# Altium footprint library Molex FFC - FPC Connectors (Through-Hole).PcbLib: 219 footprints (part 1 of 14)
Each footprint in its own frame and in the unit in brackets; x right, y up, seen from the top. Pads: shape width x height; smd on the part's side, far side on the other; paste and mask are expansions set on the pad; w line width, h text height; cw(c..) or ccw(c..) is an arc to the next point about the centre after c.
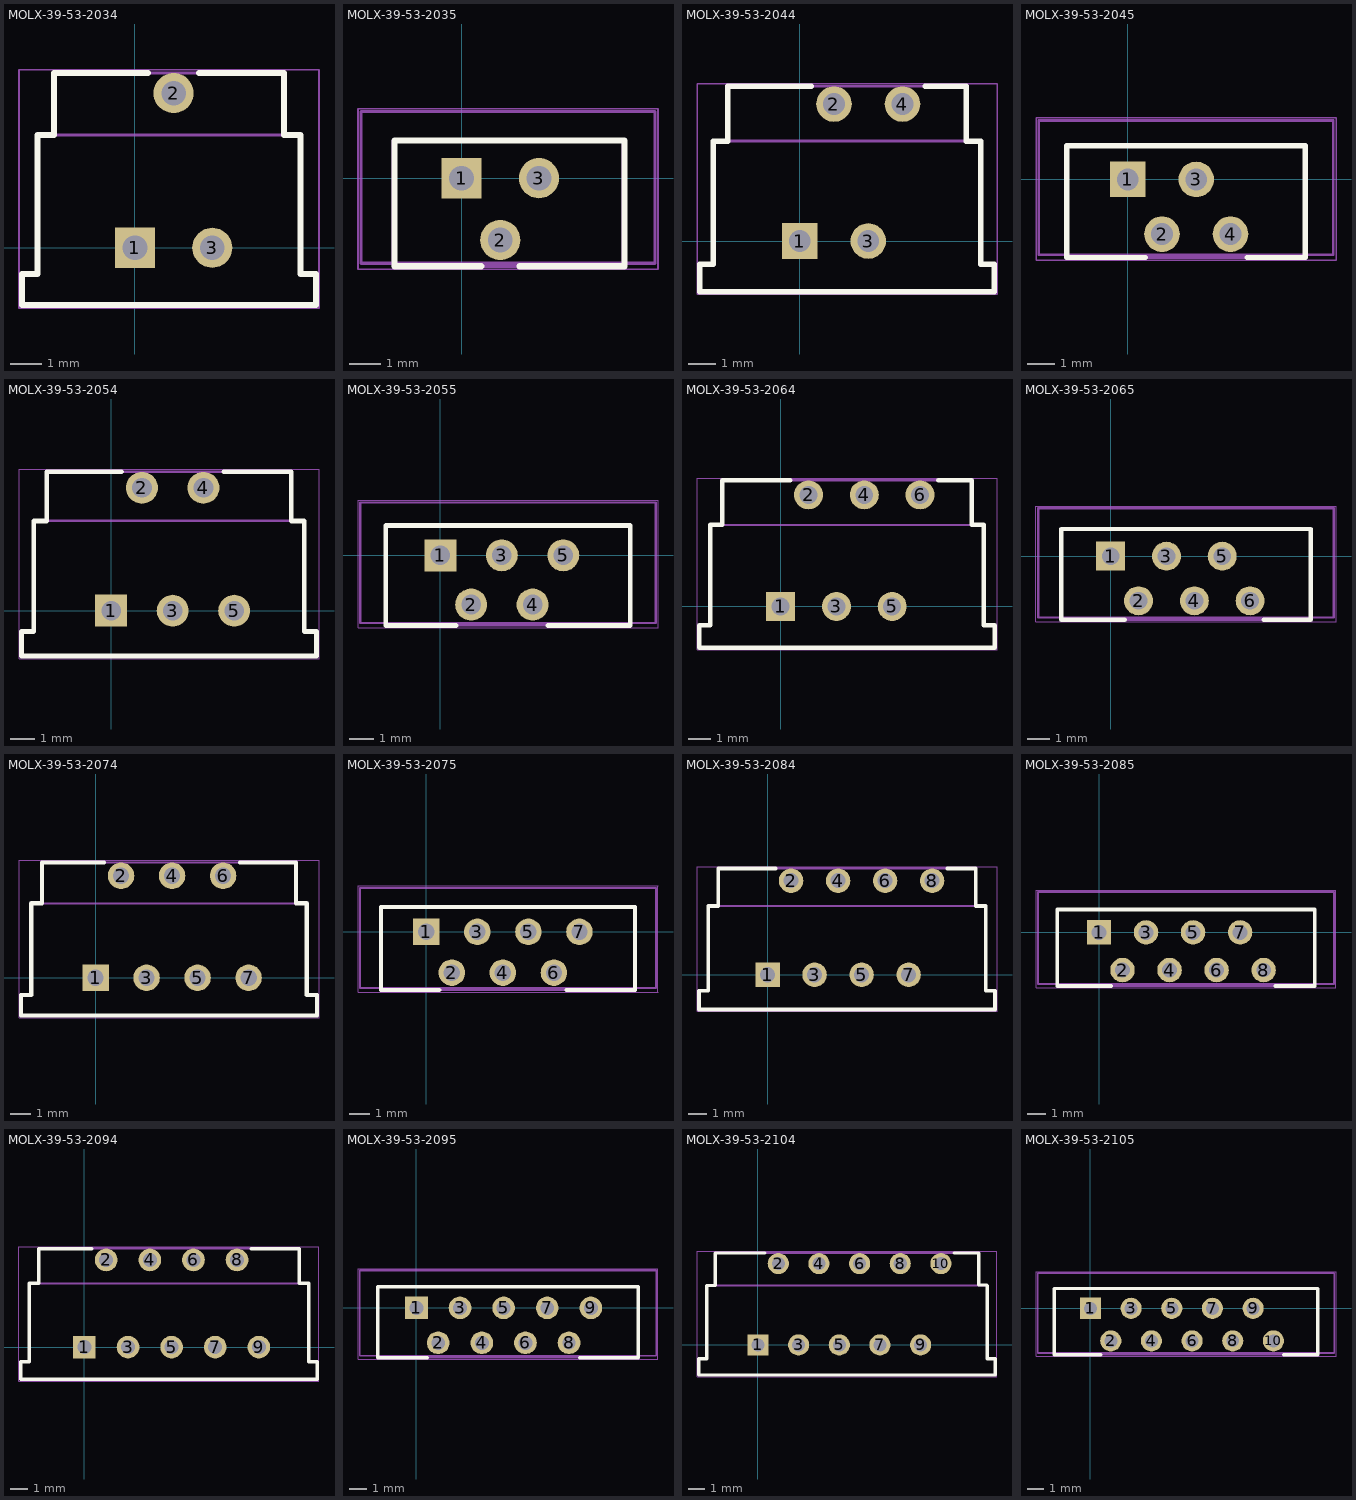
[diagram p0: the footprints below, top view; thin cyan lines are the x and y axes]

## MOLX-39-53-2034 [mm] "FPC Connector, 3-Leads, Right Angle, Pitch 1.25 mm, Mated Height 5.0 mm, Through Hole"
height 5.412
pads (3):
  rect 1.3x1.3 hole 0.8: 1(0,0)
  round 1.3 hole 0.8: 2(1.25,5) 3(2.5,0)
Top Overlay:
  lines w0.2: 0.425,5.65 -2.62,5.65 -2.62,3.649 -3.15,3.649 -3.15,-0.85 -3.65,-0.85 -3.65,-1.85 5.85,-1.85 ; 2.075,5.65 4.82,5.65 4.82,3.649 5.35,3.649 5.35,-0.85 5.85,-0.85 5.85,-1.85
Mechanical 13:
  lines w0.1: -2.62,3.649 -3.15,3.649 -3.15,-0.85 -3.65,-0.85 -3.65,-1.85 5.85,-1.85 ; 4.82,3.649 4.82,5.65 -2.62,5.65 -2.62,3.649 5.35,3.649 5.35,-0.85 5.85,-0.85 5.85,-1.85
Mechanical 15:
  lines w0.05: -3.75,-1.95 -3.75,5.75 5.95,5.75 5.95,-1.95 -3.75,-1.95
3D body "039532034.stp": height 5.41, standoff -3.49, extent -3.65,-1.85 5.85,5.65

## MOLX-39-53-2035 [mm] "FPC Connector, 3-Leads, Vertical, Pitch 1.25 mm, Mated Height 7.5 mm, Through Hole"
height 7.512
pads (3):
  rect 1.3x1.3 hole 0.8: 1(0,0)
  round 1.3 hole 0.8: 2(1.25,-2) 3(2.5,0)
Top Overlay:
  lines w0.2: 0.633,-2.85 -2.17,-2.85 -2.17,1.22 5.27,1.22 5.27,-2.85 1.867,-2.85
Mechanical 13:
  lines w0.1: -3.25,-2.75 -3.25,2.15 6.25,2.15 6.25,-2.75 -3.25,-2.75 ; -2.22,-2.85 5.22,-2.85 5.22,1.22 -2.22,1.22 -2.22,-2.85
Mechanical 15:
  lines w0.05: -3.35,-2.95 -3.35,2.25 6.35,2.25 6.35,-2.95 -3.35,-2.95
3D body "039532035.stp": height 7.51, standoff -3.49, extent -3.25,-2.85 6.25,2.15

## MOLX-39-53-2044 [mm] "FPC Connector, 4-Leads, Right Angle, Pitch 1.25 mm, Mated Height 5.0 mm, Through Hole"
height 5.412
pads (4):
  rect 1.3x1.3 hole 0.8: 1(0,0)
  round 1.3 hole 0.8: 2(1.25,5) 3(2.5,0) 4(3.75,5)
Top Overlay:
  lines w0.2: 0.425,5.65 -2.62,5.65 -2.62,3.65 -3.15,3.65 -3.15,-0.85 -3.65,-0.85 -3.65,-1.85 7.1,-1.85 7.1,-0.85 6.6,-0.85 6.6,3.65 6.07,3.65 6.07,5.65 4.575,5.65
Mechanical 13:
  lines w0.1: -3.15,3.65 -3.15,-0.85 -3.65,-0.85 -3.65,-1.85 7.1,-1.85 7.1,-0.85 6.6,-0.85 6.6,3.65 -3.15,3.65 ; -2.62,3.65 -2.62,5.65 6.07,5.65 6.07,3.65
Mechanical 15:
  lines w0.05: -3.75,-1.95 -3.75,5.75 7.2,5.75 7.2,-1.95 -3.75,-1.95
3D body "039532044.stp": height 5.41, standoff -3.49, extent -3.65,-1.85 7.1,5.65

## MOLX-39-53-2045 [mm] "FPC Connector, 4-Leads, Vertical, Pitch 1.25 mm, Mated Height 7.5 mm, Through Hole"
height 7.512
pads (4):
  rect 1.3x1.3 hole 0.8: 1(0,0)
  round 1.3 hole 0.8: 2(1.25,-2) 3(2.5,0) 4(3.75,-2)
Top Overlay:
  lines w0.2: 0.633,-2.85 -2.22,-2.85 -2.22,1.22 6.47,1.22 6.47,-2.85 4.367,-2.85
Mechanical 13:
  lines w0.1: -3.25,-2.75 7.5,-2.75 7.5,2.15 -3.25,2.15 -3.25,-2.75 ; -2.22,-2.85 6.47,-2.85 6.47,1.22 -2.22,1.22 -2.22,-2.85
Mechanical 15:
  lines w0.05: -3.35,-2.95 7.6,-2.95 7.6,2.25 -3.35,2.25 -3.35,-2.95
3D body "039532045.stp": height 7.51, standoff -3.49, extent -3.25,-2.85 7.5,2.15

## MOLX-39-53-2054 [mm] "FPC Connector, 5-Leads, Right Angle, Pitch 1.25 mm, Mated Height 5.0 mm, Through Hole"
height 5.412
pads (5):
  rect 1.3x1.3 hole 0.8: 1(0,0)
  round 1.3 hole 0.8: 2(1.25,5) 3(2.5,0) 4(3.75,5) 5(5,0)
Top Overlay:
  lines w0.2: 0.425,5.65 -2.62,5.65 -2.62,3.65 -3.15,3.65 -3.15,-0.85 -3.65,-0.85 -3.65,-1.85 8.35,-1.85 8.35,-0.85 7.85,-0.85 7.85,3.65 7.32,3.65 7.32,5.65 4.575,5.65
Mechanical 13:
  lines w0.1: -3.15,3.65 -3.15,-0.85 -3.65,-0.85 -3.65,-1.85 8.35,-1.85 8.35,-0.85 7.85,-0.85 7.85,3.65 -3.15,3.65 ; -2.62,3.65 -2.62,5.65 7.32,5.65 7.32,3.65
Mechanical 15:
  lines w0.05: -3.75,-1.95 -3.75,5.75 8.45,5.75 8.45,-1.95 -3.75,-1.95
3D body "039532054.stp": height 5.41, standoff -3.49, extent -3.65,-1.85 8.35,5.65

## MOLX-39-53-2055 [mm] "FPC Connector, 5-Leads, Vertical, Pitch 1.25 mm, Mated Height 7.5 mm, Through Hole"
height 7.512
pads (5):
  rect 1.3x1.3 hole 0.8: 1(0,0)
  round 1.3 hole 0.8: 2(1.25,-2) 3(2.5,0) 4(3.75,-2) 5(5,0)
Top Overlay:
  lines w0.2: 0.633,-2.85 -2.22,-2.85 -2.22,1.22 7.72,1.22 7.72,-2.85 4.367,-2.85
Mechanical 13:
  lines w0.1: -3.25,-2.75 -3.25,-2.75 ; -3.25,-2.75 8.75,-2.75 ; -3.25,-2.75 -3.25,2.15 8.75,2.15 8.75,-2.75 ; 8.75,-2.75 8.75,-2.75 ; -2.22,-2.85 7.72,-2.85 7.72,1.22 -2.22,1.22 -2.22,-2.85
Mechanical 15:
  lines w0.05: -3.35,-2.95 8.85,-2.95 8.85,2.25 -3.35,2.25 -3.35,-2.95
3D body "039532055.stp": height 7.51, standoff -3.49, extent -3.25,-2.85 8.75,2.15

## MOLX-39-53-2064 [mm] "FPC Connector, 6-Leads, Right Angle, Pitch 1.25 mm, Mated Height 5.0 mm, Through Hole"
height 5.412
pads (6):
  rect 1.3x1.3 hole 0.8: 1(0,0)
  round 1.3 hole 0.8: 2(1.25,5) 3(2.5,0) 4(3.75,5) 5(5,0) 6(6.25,5)
Top Overlay:
  lines w0.2: 0.425,5.65 -2.62,5.65 -2.62,3.65 -3.15,3.65 -3.15,-0.85 -3.65,-0.85 -3.65,-1.85 9.6,-1.85 9.6,-0.85 9.1,-0.85 9.1,3.65 8.57,3.65 8.57,5.65 7.075,5.65
Mechanical 13:
  lines w0.1: -3.15,3.65 -3.15,-0.85 -3.65,-0.85 -3.65,-1.85 9.6,-1.85 9.6,-0.85 9.1,-0.85 9.1,3.65 -3.15,3.65 ; -2.62,3.65 -2.62,5.65 8.57,5.65 8.57,3.655
Mechanical 15:
  lines w0.05: -3.75,-1.95 9.7,-1.95 9.7,5.75 -3.75,5.75 -3.75,-1.95
3D body "039532064.stp": height 5.41, standoff -3.49, extent -3.65,-1.85 9.6,5.65

## MOLX-39-53-2065 [mm] "FPC Connector, 6-Leads, Vertical, Pitch 1.25 mm, Mated Height 7.5 mm, Through Hole"
height 7.512
pads (6):
  rect 1.3x1.3 hole 0.8: 1(0,0)
  round 1.3 hole 0.8: 2(1.25,-2) 3(2.5,0) 4(3.75,-2) 5(5,0) 6(6.25,-2)
Top Overlay:
  lines w0.2: 0.633,-2.85 -2.22,-2.85 -2.22,1.22 8.97,1.22 8.97,-2.85 6.867,-2.85
Mechanical 13:
  lines w0.1: -3.25,-2.75 -3.25,2.15 10,2.15 10,-2.75 -3.25,-2.75 ; -2.22,-2.85 8.97,-2.85 8.97,1.22 -2.22,1.22 -2.22,-2.85
Mechanical 15:
  lines w0.05: -3.35,-2.95 -3.35,2.25 10.1,2.25 10.1,-2.95 -3.35,-2.95
3D body "039532065.stp": height 7.51, standoff -3.49, extent -3.25,-2.85 10,2.15

## MOLX-39-53-2074 [mm] "FPC Connector, 7-Leads, Right Angle, Pitch 1.25 mm, Mated Height 5.0 mm, Through Hole"
height 5.412
pads (7):
  rect 1.3x1.3 hole 0.8: 1(0,0)
  round 1.3 hole 0.8: 2(1.25,5) 3(2.5,0) 4(3.75,5) 5(5,0) 6(6.25,5) 7(7.5,0)
Top Overlay:
  lines w0.2: 0.425,5.65 -2.62,5.65 -2.62,3.65 -3.15,3.65 -3.15,-0.85 -3.65,-0.85 -3.65,-1.85 10.85,-1.85 10.85,-0.85 10.35,-0.85 10.35,3.65 9.82,3.65 9.82,5.65 7.075,5.65
Mechanical 13:
  lines w0.1: -3.15,3.65 -3.15,-0.85 -3.65,-0.85 -3.65,-1.85 10.85,-1.85 10.85,-0.875 ; -3.15,3.65 10.35,3.65 10.35,-0.85 10.85,-0.85 ; -2.62,3.65 -2.62,5.65 9.82,5.65 9.82,3.65
Mechanical 15:
  lines w0.05: -3.75,-1.95 10.95,-1.95 10.95,5.75 -3.75,5.75 -3.75,-1.95
3D body "039532074.stp": height 5.41, standoff -3.49, extent -3.65,-1.85 10.85,5.65

## MOLX-39-53-2075 [mm] "FPC Connector, 7-Leads, Vertical, Pitch 1.25 mm, Mated Height 7.5 mm, Through Hole"
height 7.512
pads (7):
  rect 1.3x1.3 hole 0.8: 1(0,0)
  round 1.3 hole 0.8: 2(1.25,-2) 3(2.5,0) 4(3.75,-2) 5(5,0) 6(6.25,-2) 7(7.5,0)
Top Overlay:
  lines w0.2: 0.633,-2.85 -2.22,-2.85 -2.22,1.22 10.22,1.22 10.22,-2.85 6.867,-2.85
Mechanical 13:
  lines w0.1: -3.25,-2.75 -3.25,2.15 11.25,2.15 11.25,-2.75 -3.25,-2.75 ; -2.22,-2.85 10.22,-2.85 10.22,1.22 -2.22,1.22 -2.22,-2.85
Mechanical 15:
  lines w0.05: -3.35,-2.95 -3.35,2.25 11.35,2.25 11.35,-2.95 -3.35,-2.95
3D body "039532075.stp": height 7.51, standoff -3.49, extent -3.25,-2.85 11.25,2.15

## MOLX-39-53-2084 [mm] "FPC Connector, 8-Leads, Right Angle, Pitch 1.25 mm, Mated Height 5.0 mm, Through Hole"
height 5.412
pads (8):
  rect 1.3x1.3 hole 0.8: 1(0,0)
  round 1.3 hole 0.8: 2(1.25,5) 3(2.5,0) 4(3.75,5) 5(5,0) 6(6.25,5) 7(7.5,0) 8(8.75,5)
Top Overlay:
  lines w0.2: 0.425,5.65 -2.62,5.65 -2.62,3.65 -3.15,3.65 -3.15,-0.85 -3.65,-0.85 -3.65,-1.85 12.1,-1.85 12.1,-0.85 11.6,-0.85 11.6,3.65 11.07,3.65 11.07,5.65 9.575,5.65
Mechanical 13:
  lines w0.1: -3.15,3.65 -3.15,-0.85 -3.65,-0.85 -3.65,-1.85 12.1,-1.85 12.1,-0.875 ; -3.15,3.65 11.6,3.65 11.6,-0.85 12.1,-0.85 ; -2.62,3.65 -2.62,5.65 11.07,5.65 11.07,3.65
Mechanical 15:
  lines w0.05: -3.75,-1.95 -3.75,5.75 12.2,5.75 12.2,-1.95 -3.75,-1.95
3D body "039532084.stp": height 5.41, standoff -3.49, extent -3.65,-1.85 12.1,5.65

## MOLX-39-53-2085 [mm] "FPC Connector, 8-Leads, Vertical, Pitch 1.25 mm, Mated Height 7.5 mm, Through Hole"
height 7.512
pads (8):
  rect 1.3x1.3 hole 0.8: 1(0,0)
  round 1.3 hole 0.8: 2(1.25,-2) 3(2.5,0) 4(3.75,-2) 5(5,0) 6(6.25,-2) 7(7.5,0)
  round 1.3 hole 0.762: 8(8.75,-2)
Top Overlay:
  lines w0.2: 0.633,-2.85 -2.22,-2.85 -2.22,1.22 11.47,1.22 ; 9.367,-2.85 11.47,-2.85 11.47,1.22
Mechanical 13:
  lines w0.1: -3.25,-2.75 12.5,-2.75 12.5,2.15 -3.25,2.15 -3.25,-2.75 ; -2.22,-2.85 -2.22,1.22 11.47,1.22 11.47,-2.85 -2.22,-2.85
Mechanical 15:
  lines w0.05: -3.35,-2.95 12.6,-2.95 12.6,2.25 -3.35,2.25 -3.35,-2.95
3D body "039532085.stp": height 7.51, standoff -3.49, extent -3.25,-2.85 12.5,2.15

## MOLX-39-53-2094 [mm] "FPC Connector, 9-Leads, Right Angle, Pitch 1.25 mm, Mated Height 5.0 mm, Through Hole"
height 5.412
pads (9):
  rect 1.3x1.3 hole 0.8: 1(0,0)
  round 1.3 hole 0.8: 2(1.25,5) 3(2.5,0) 4(3.75,5) 5(5,0) 6(6.25,5) 7(7.5,0) 8(8.75,5) 9(10,0)
Top Overlay:
  lines w0.2: 0.425,5.65 -2.62,5.65 -2.62,3.649 -3.15,3.649 -3.15,-0.85 -3.65,-0.85 -3.65,-1.85 13.35,-1.85 13.35,-0.85 12.85,-0.85 12.85,3.65 12.32,3.65 12.32,5.65 9.575,5.65
Mechanical 13:
  lines w0.1: -2.62,3.649 -3.15,3.649 -3.15,-0.85 -3.65,-0.85 -3.65,-1.85 13.351,-1.85 13.35,-0.85 12.85,-0.85 12.85,3.65 12.32,3.65 12.32,5.65 -2.62,5.65 -2.62,3.649 12.32,3.649
Mechanical 15:
  lines w0.05: -3.75,-1.95 -3.75,5.75 13.45,5.75 13.45,-1.95 -3.75,-1.95
3D body "039532094.stp": height 5.41, standoff -3.49, extent -3.649,-1.85 13.351,5.65

## MOLX-39-53-2095 [mm] "FPC Connector, 9-Leads, Vertical, Pitch 1.25 mm, Mated Height 7.5 mm, Through Hole"
height 7.512
pads (9):
  rect 1.3x1.3 hole 0.8: 1(0,0)
  round 1.3 hole 0.8: 2(1.25,-2) 3(2.5,0) 4(3.75,-2) 5(5,0) 6(6.25,-2) 7(7.5,0) 9(10,0)
  round 1.3 hole 0.762: 8(8.75,-2)
Top Overlay:
  lines w0.2: 0.633,-2.85 -2.22,-2.85 -2.22,1.22 12.72,1.22 12.72,-2.85 9.367,-2.85
Mechanical 13:
  lines w0.1: -3.25,-2.75 13.75,-2.75 13.75,2.15 -3.25,2.15 -3.25,-2.75 ; -2.22,-2.85 -2.22,1.22 12.72,1.22 12.72,-2.85 -2.22,-2.85
Mechanical 15:
  lines w0.05: -3.35,-2.95 13.85,-2.95 13.85,2.25 -3.35,2.25 -3.35,-2.95
3D body "039532095.stp": height 7.51, standoff -3.49, extent -3.25,-2.85 13.75,2.15

## MOLX-39-53-2104 [mm] "FPC Connector, 10-Leads, Right Angle, Pitch 1.25 mm, Mated Height 5.0 mm, Through Hole"
height 5.412
pads (10):
  rect 1.3x1.3 hole 0.8: 1(0,0)
  round 1.3 hole 0.8: 2(1.25,5) 3(2.5,0) 4(3.75,5) 5(5,0) 6(6.25,5) 7(7.5,0) 8(8.75,5) 9(10,0) 10(11.25,5)
Top Overlay:
  lines w0.2: -2.63,3.65 -3.15,3.65 -3.15,-0.85 -3.65,-0.85 -3.65,-1.85 14.6,-1.85 14.6,-0.85 14.1,-0.85 14.1,3.65 ; -2.62,3.66 -2.62,5.65 0.425,5.65 ; 12.075,5.65 13.57,5.65 13.57,3.68 14.07,3.68
Mechanical 13:
  lines w0.1: -2.62,3.66 -2.62,5.65 13.57,5.65 13.57,3.68 ; -3.65,-1.85 14.6,-1.85 14.6,-0.85 14.1,-0.85 14.1,3.65 -3.15,3.65 -3.15,-0.85 -3.65,-0.85 -3.65,-1.85
Mechanical 15:
  lines w0.05: -3.75,-1.95 -3.75,5.75 14.7,5.75 14.7,-1.95 -3.75,-1.95
3D body "039532104.stp": height 5.41, standoff -3.49, extent -3.65,-1.85 14.6,5.65

## MOLX-39-53-2105 [mm] "FPC Connector, 10-Leads, Vertical, Pitch 1.25 mm, Mated Height 7.5 mm, Through Hole"
height 7.512
pads (10):
  rect 1.3x1.3 hole 0.8: 1(0,0)
  round 1.3 hole 0.8: 2(1.25,-2) 3(2.5,0) 4(3.75,-2) 5(5,0) 6(6.25,-2) 7(7.5,0) 9(10,0) 10(11.25,-2)
  round 1.3 hole 0.762: 8(8.75,-2)
Top Overlay:
  lines w0.2: 0.633,-2.85 -2.22,-2.85 -2.22,1.22 13.97,1.22 13.97,-2.85 11.867,-2.85
Mechanical 13:
  lines w0.1: -3.25,-2.75 15,-2.75 15,2.15 -3.25,2.15 -3.25,-2.75 ; -2.22,-2.85 -2.22,1.22 13.97,1.22 13.97,-2.85 -2.22,-2.85
Mechanical 15:
  lines w0.05: -3.35,-2.95 15.1,-2.95 15.1,2.25 -3.35,2.25 -3.35,-2.95
3D body "039532105.stp": height 7.51, standoff -3.49, extent -3.25,-2.85 15,2.15